# Altium footprint library OneBoxLib_RCL.PcbLib: 50 footprints (part 3 of 4)
Each footprint in its own frame and in the unit in brackets; x right, y up, seen from the top. Pads: shape width x height; smd on the part's side, far side on the other; paste and mask are expansions set on the pad; w line width, h text height; cw(c..) or ccw(c..) is an arc to the next point about the centre after c.
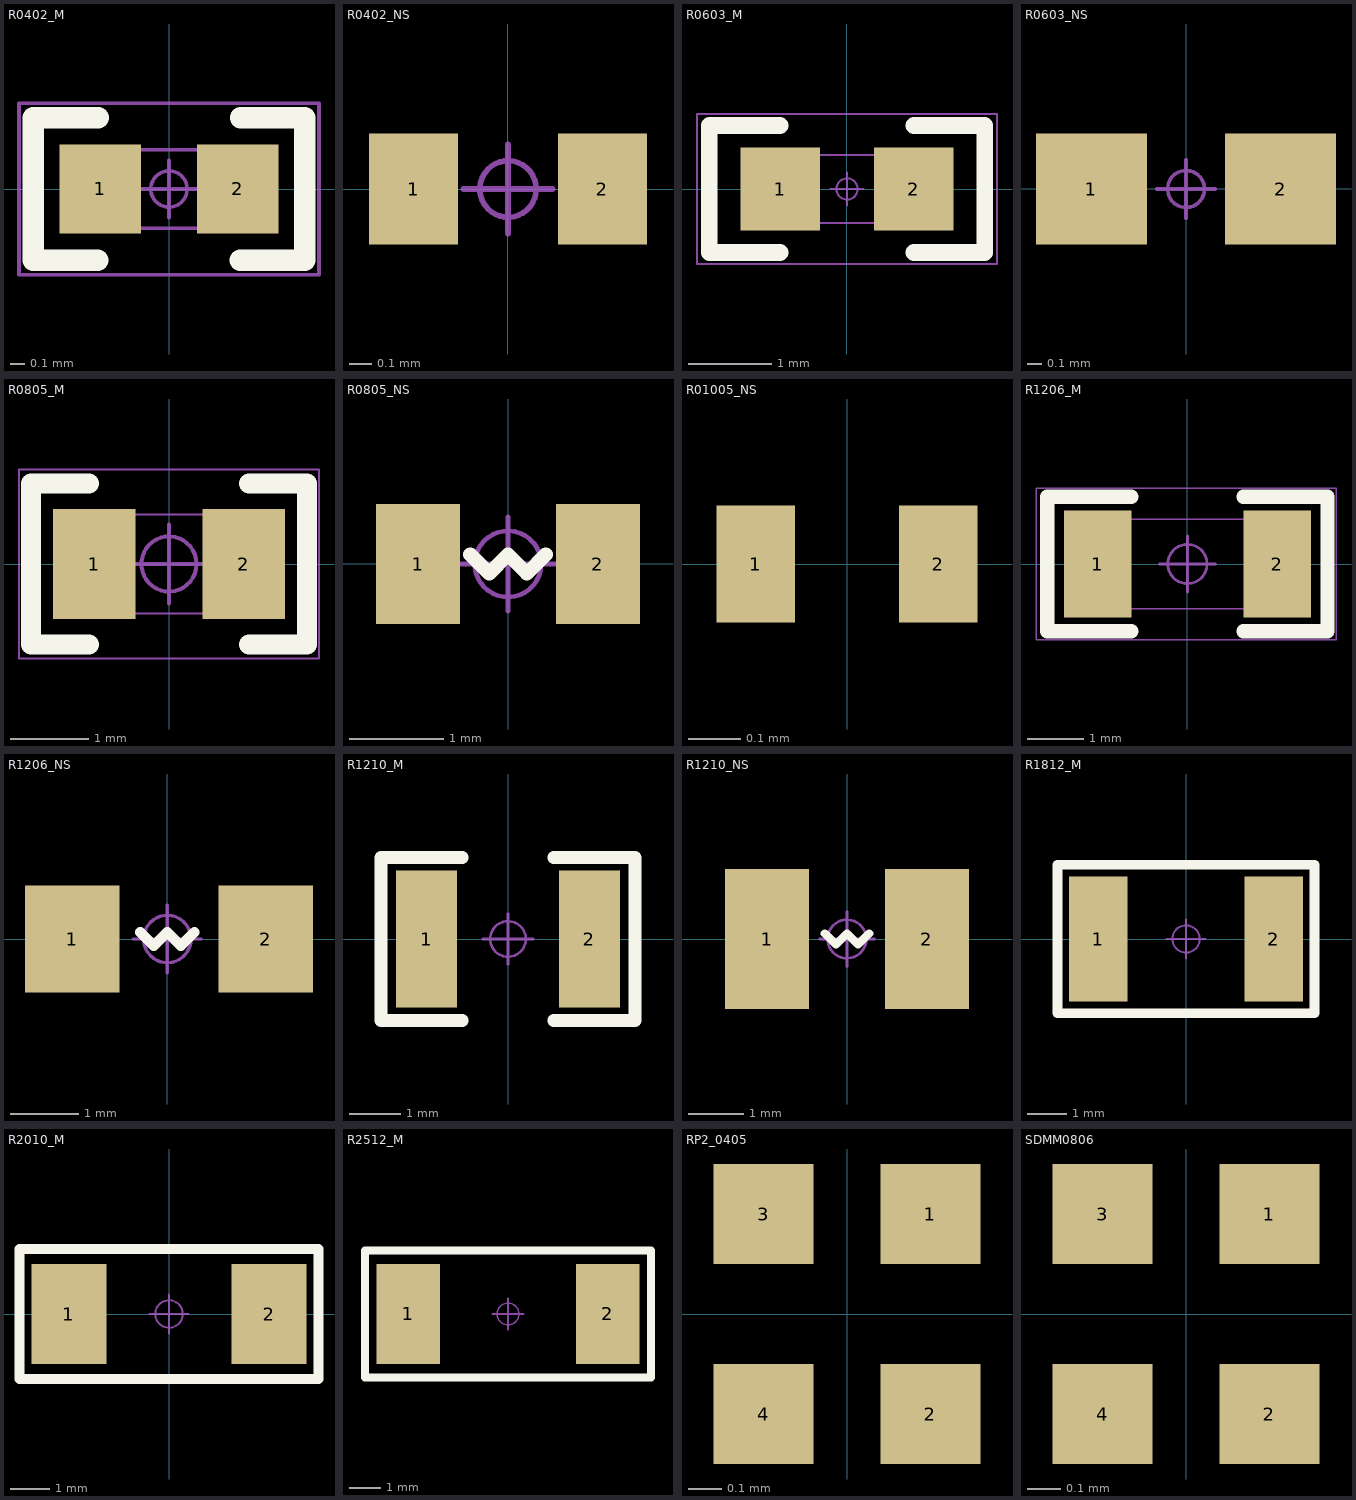
[diagram p2: the footprints below, top view; thin cyan lines are the x and y axes]

## R0402_M [mm] "1/16W贴片电阻"
pads (2):
  rect 0.57x0.62 smd: 1(-0.48,0) 2(0.48,0)
Top Overlay:
  lines w0.15: -0.95,0.49 -0.95,-0.5 -0.499,-0.5 ; -0.95,0.5 -0.496,0.5 ; 0.498,-0.5 0.95,-0.5 0.95,0.5 0.5,0.5
Mechanical 13:
  lines w0.025: -0.575,-0.275 -0.575,0.275 0.575,0.275 0.575,-0.275 -0.575,-0.275
Mechanical 15:
  circle w0.025: c0,0 r0.127
  lines w0.025: -0.2,0 0.2,0 ; 0,-0.2 0,0.2 ; -1.05,-0.6 -1.05,0.6 1.05,0.6 1.05,-0.6 -1.05,-0.6
3D body "R0402.STEP": height 0.3, standoff 0, extent -0.5,-0.25 0.5,0.25

## R0402_NS [mm] "1/16W贴片电阻-无丝印"
pads (2):
  rect 0.4x0.5 smd: 1(-0.425,0) 2(0.425,0)
Mechanical 15:
  circle w0.025: c0,0 r0.127
  lines w0.025: -0.2,0 0.2,0 ; 0,-0.2 0,0.2
3D body "R0402.STEP": height 0.3, standoff 0, extent -0.5,-0.25 0.5,0.25

## R0603_M [mm] "1/10W贴片电阻"
pads (2):
  rect 0.95x1 smd: 1(-0.8,0) 2(0.8,0)
Top Overlay:
  lines w0.2: -0.8,-0.762 -1.651,-0.762 -1.651,0.762 -0.8,0.762 ; 0.8,-0.762 1.651,-0.762 1.651,0.762 0.8,0.762
Mechanical 13:
  lines w0.025: -0.838,-0.406 0.762,-0.406 0.762,0.406 -0.838,0.406 -0.838,-0.406
Mechanical 15:
  circle w0.025: c0,0 r0.127
  lines w0.025: -0.2,0 0.2,0 ; 0,-0.2 0,0.2 ; -1.8,-0.9 1.8,-0.9 1.8,0.9 -1.8,0.9 -1.8,-0.9
3D body "R0603.STEP": height 0.4, standoff 0, extent -0.8,-0.4 0.8,0.4

## R0603_NS [mil] "1/10W贴片电阻-无丝印"
pads (2):
  rect 30x30 smd: 1(-25.59,0) 2(25.59,0)
Mechanical 15:
  circle w1: c0,0 r5
  lines w1: -7.87,0 7.87,0 ; 0,-7.87 0,7.87
3D body "R0603.STEP": height 15.79, standoff 0, extent -31.49,-15.74 31.5,15.75

## R0805_M [mm] "1/8W贴片电阻"
pads (2):
  rect 1.05x1.4 smd: 1(-0.95,0) 2(0.95,0)
Top Overlay:
  lines w0.254: -1.019,-1.02 -1.75,-1.02 -1.75,1.02 -1.019,1.02 ; 1.019,-1.02 1.75,-1.02 1.75,1.02 1.019,1.02
Mechanical 13:
  lines w0.025: -1,-0.63 -1,0.63 1,0.63 1,-0.63 -1,-0.63
Mechanical 15:
  circle w0.05: c0,0 r0.35
  lines w0.025: -1.905,-1.2 1.905,-1.2 1.905,1.2 -1.905,1.2 -1.905,-1.2
  lines w0.05: -0.5,0 0.5,0 ; 0,-0.5 0,0.5
3D body "R0805.STEP": height 0.5, standoff 0, extent -1,-0.625 1,0.625

## R0805_NS [mil] "1/8W贴片电阻-无丝印"
pads (2):
  rect 35x50 smd: 1(-37.4,0) 2(37.4,0)
Top Overlay:
  lines w6: -15.75,3.94 -7.87,-3.94 0,3.94 7.87,-3.94 15.75,3.94
Mechanical 15:
  circle w1.97: c0,0 r13.78
  lines w1.97: -19.68,0 19.68,0 ; 0,-19.68 0,19.68
3D body "R0805.STEP": height 19.72, standoff 0, extent -39.36,-24.6 39.38,24.61

## R01005_NS [mm] "1/32W贴片电阻-无丝印"
pads (2):
  rect 0.15x0.225 smd paste+0 mask+0: 1(-0.175,0) 2(0.175,0)
3D body "R01005.STEP": height 0.13, standoff 0, extent -0.199,-0.1 0.199,0.1

## R1206_M [mm] "1/4W贴片电阻"
pads (2):
  rect 1.2x1.9 smd: 1(-1.6,0) 2(1.6,0)
Top Overlay:
  lines w0.254: -1,-1.2 -2.5,-1.2 -2.5,1.2 -1,1.2 ; 1,-1.2 2.5,-1.2 2.5,1.2 1,1.2
Mechanical 13:
  lines w0.025: -1.6,-0.8 1.6,-0.8 1.6,0.8 -1.6,0.8 -1.6,-0.8
Mechanical 15:
  circle w0.05: c0,0 r0.35
  lines w0.025: -2.7,-1.35 -2.7,1.35 2.65,1.35 2.65,-1.35 -2.7,-1.35
  lines w0.05: -0.5,0 0.5,0 ; 0,-0.5 0,0.5
3D body "R1206.STEP": height 0.55, standoff 0, extent -1.6,-0.8 1.6,0.8

## R1206_NS [mil] "1/4W贴片电阻-无丝印"
pads (2):
  rect 55x62 smd: 1(-55.12,0) 2(57.09,0)
Top Overlay:
  lines w6: -15.75,3.94 -7.87,-3.94 0,3.94 7.87,-3.94 15.75,3.94
Mechanical 15:
  circle w1.97: c0,0 r13.78
  lines w1.97: -19.68,0 19.68,0 ; 0,-19.68 0,19.68
3D body "R1206.STEP": height 21.69, standoff 0, extent -62.99,-31.49 63,31.5

## R1210_M [mm] "1/3W贴片电阻"
pads (2):
  rect 1.2x2.7 smd: 1(-1.6,0) 2(1.6,0)
Top Overlay:
  lines w0.254: -0.9,-1.6 -2.5,-1.6 -2.5,1.6 -0.9,1.6 ; 0.9,-1.6 2.5,-1.6 2.5,1.6 0.9,1.6
Mechanical 15:
  circle w0.05: c0,0 r0.35
  lines w0.05: -0.5,0 0.5,0 ; 0,-0.5 0,0.5

## R1210_NS [mm] "1/3W贴片电阻"
pads (2):
  rect 1.524x2.54 smd: 1(-1.45,0) 2(1.45,0)
Top Overlay:
  lines w0.152: -0.4,0.1 -0.2,-0.1 0,0.1 0.2,-0.1 0.4,0.1
Mechanical 15:
  circle w0.05: c0,0 r0.35
  lines w0.05: -0.5,0 0.5,0 ; 0,-0.5 0,0.5
3D body "1210_-2asm.STEP": height 0.55, standoff 0, extent -1.575,-1.25 1.625,1.25

## R1812_M [mm] "1/2W贴片电阻"
pads (2):
  rect 1.5x3.2 smd: 1(-2.25,0) 2(2.25,0)
Top Overlay:
  lines w0.254: -1.27,1.905 1.016,1.905 3.302,1.905 3.302,-0.508 3.302,-1.905 1.016,-1.905 -1.016,-1.905 -3.302,-1.905 -3.302,1.905 -1.016,1.905
Mechanical 15:
  circle w0.05: c0,0 r0.35
  lines w0.05: -0.5,0 0.5,0 ; 0,-0.5 0,0.5
3D body "R1812.STEP": height 0.55, standoff 0, extent -2.25,-1.6 2.25,1.6

## R2010_M [mm] "3/4W贴片电阻"
pads (2):
  rect 1.905x2.54 smd: 1(-2.55,0) 2(2.55,0)
Top Overlay:
  lines w0.254: -3.81,-1.651 -3.81,0.635 -3.81,1.651 1.27,1.651 3.81,1.651 3.81,-0.635 3.81,-1.651 1.27,-1.651 -3.81,-1.651
Mechanical 15:
  circle w0.05: c0,0 r0.35
  lines w0.05: -0.5,0 0.5,0 ; 0,-0.5 0,0.5
3D body "R2010.STEP": height 0.55, standoff 0, extent -2.5,-1.25 2.5,1.25

## R2512_M [mm] "1W贴片电阻"
pads (2):
  rect 2.032x3.2 smd: 1(-1273.2,-1270) 2(-1266.8,-1270)
Top Overlay:
  lines w0.254: -1274.572,-1272.032 -1274.572,-1267.968 -1265.428,-1267.968 -1265.428,-1272.032 -1274.572,-1272.032
Mechanical 15:
  circle w0.05: c-1270,-1270 r0.35
  lines w0.05: -1270.5,-1270 -1269.5,-1270 ; -1270,-1270.5 -1270,-1269.5
3D body "R2512.STEP": height 0.55, standoff 0, extent -1273.2,-1271.6 -1266.8,-1268.4

## RP2_0405 [mm]
pads (4):
  rect 0.3x0.3 smd: 1(0.25,0.3) 2(0.25,-0.3) 3(-0.25,0.3) 4(-0.25,-0.3)

## SDMM0806 [mm]
pads (4):
  rect 0.3x0.3 smd: 1(0.25,0.3) 2(0.25,-0.3) 3(-0.25,0.3) 4(-0.25,-0.3)